# Altium schematic symbol library altera.SCHLIB: 68 symbols (part 3 of 6) (continued)
## EPF10K130-BGA672 (continued)
part 183 pins: AF4 NC
part 184 pins: AF5 NC
part 185 pins: AF6 NC
part 186 pins: AF7 NC
part 187 pins: AF8 NC
part 188 pins: AF9 NC
part 189 pins: AF10 NC
part 190 pins: AF11 NC
part 191 pins: AF12 NC
part 192 pins: AF13 NC
part 193 pins: AF14 NC
part 194 pins: AF15 NC
part 195 pins: AF16 NC
part 196 pins: AF17 NC
part 197 pins: AF18 NC
part 198 pins: AF20 NC
part 199 pins: AF21 NC
part 200 pins: AF23 NC
part 201 pins: AF24 NC
part 202 pins: A3 NC
part 203 pins: A4 NC
part 204 pins: A5 NC
part 205 pins: A6 NC
part 206 pins: A8 NC
part 207 pins: A9 NC
part 208 pins: A10 NC
part 209 pins: A11 NC
part 210 pins: A12 NC
part 211 pins: A13 NC
part 212 pins: A14 NC
part 213 pins: A15 NC
part 214 pins: A16 NC
part 215 pins: A17 NC
part 216 pins: A18 NC
part 217 pins: A19 NC
part 218 pins: A20 NC
part 219 pins: A21 NC
part 220 pins: A22 NC
part 221 pins: A23 NC
part 222 pins: A24 NC
part 223 pins: B3 NC
part 224 pins: B4 NC
part 225 pins: B5 NC
part 226 pins: B6 NC
part 227 pins: B7 NC
part 228 pins: B8 NC
part 229 pins: B9 NC
part 230 pins: B10 NC
part 231 pins: B11 NC
part 232 pins: B12 NC
part 233 pins: B13 NC
part 234 pins: B14 NC
part 235 pins: B16 NC
part 236 pins: B19 NC
part 237 pins: B20 NC
part 238 pins: B21 NC
part 239 pins: B22 NC
part 240 pins: B23 NC
part 241 pins: B24 NC
part 242 pins: B26 NC
part 243 pins: C1 NC
part 244 pins: C25 NC
part 245 pins: C26 NC
part 246 pins: D1 NC
part 247 pins: D2 NC
part 248 pins: D25 NC
part 249 pins: D26 NC
part 250 pins: E1 NC
part 251 pins: E25 NC
part 252 pins: E26 NC
part 253 pins: F1 NC
part 254 pins: F25 NC
part 255 pins: G25 NC
part 256 pins: G26 NC
part 257 pins: H1 NC
part 258 pins: J1 NC
part 259 pins: J25 NC
part 260 pins: J26 NC
part 261 pins: K26 NC
part 262 pins: L2 NC
part 263 pins: L25 NC
part 264 pins: N2 NC
part 265 pins: P1 NC
part 266 pins: P2 NC
part 267 pins: R1 NC
part 268 pins: R26 NC
part 269 pins: T1 NC
part 270 pins: U1 NC
part 271 pins: U25 NC
part 272 pins: V1 NC
part 273 pins: V26 NC
part 274 pins: W1 NC
part 275 pins: Y26 NC

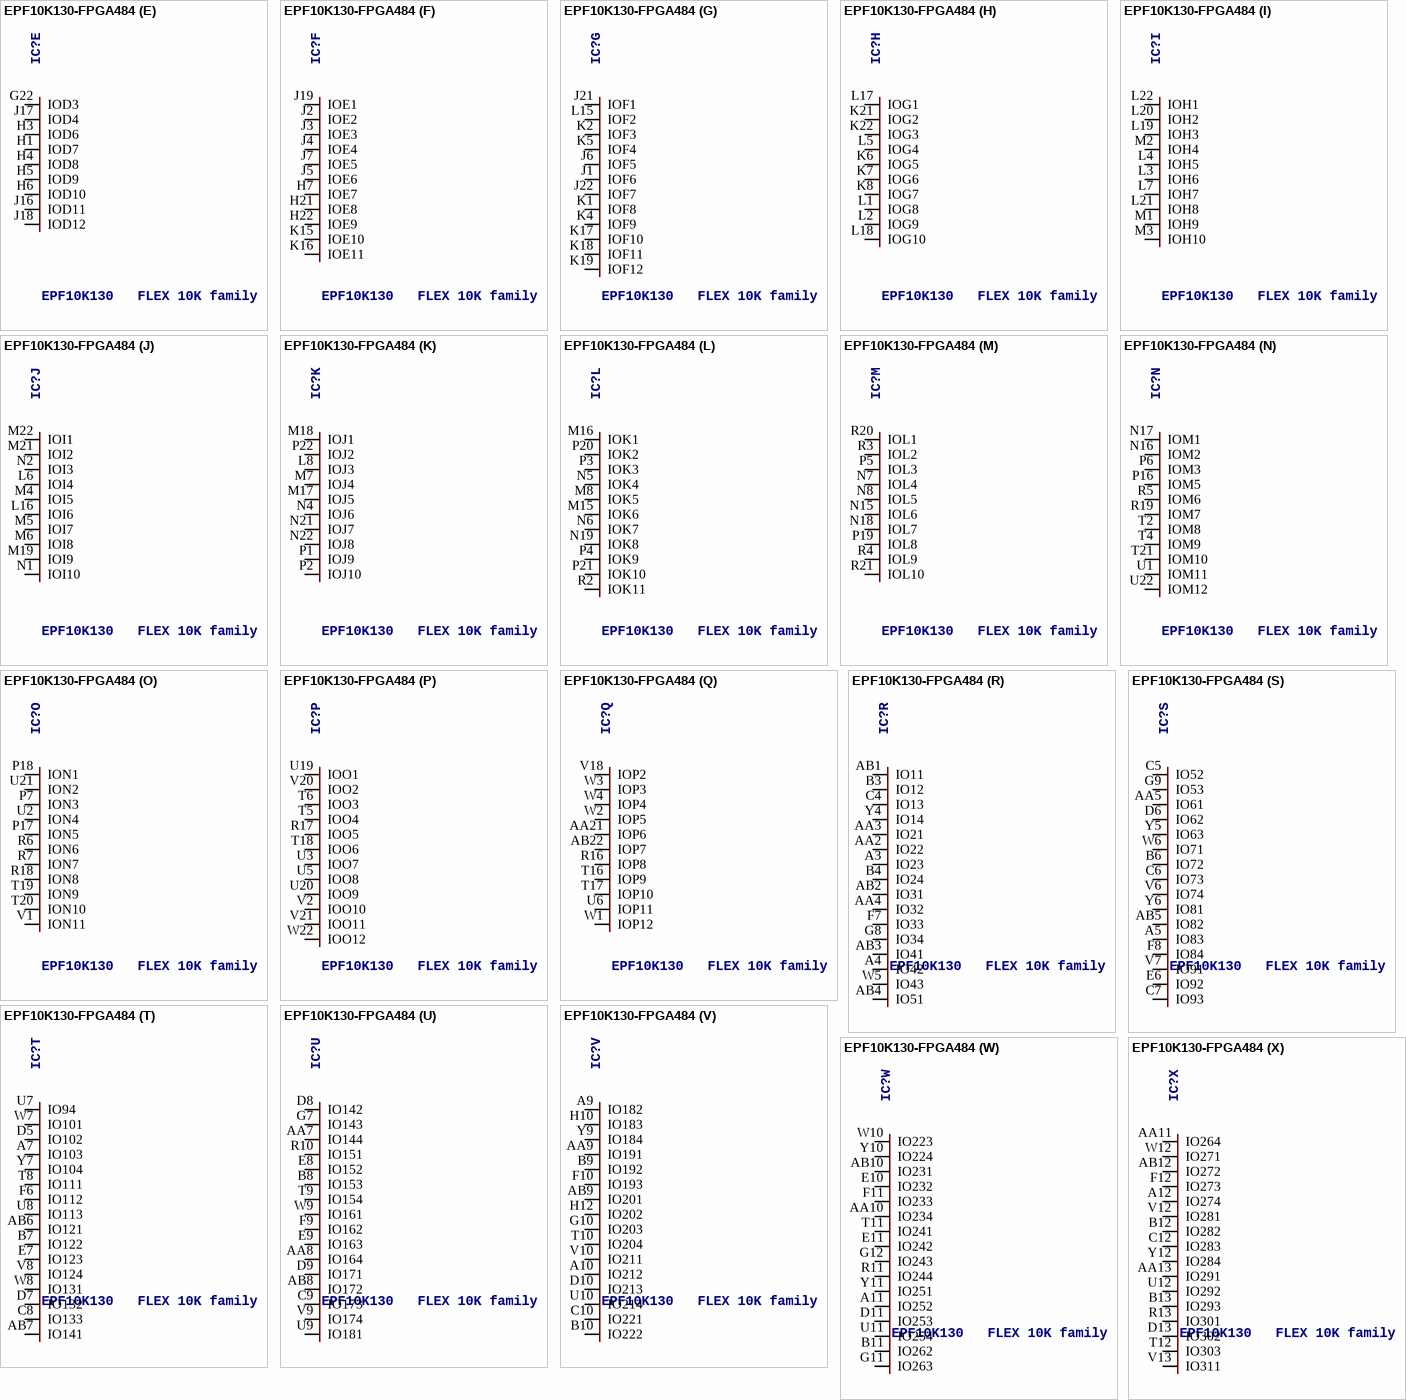
[diagram p25: symbol EPF10K130-FPGA484]

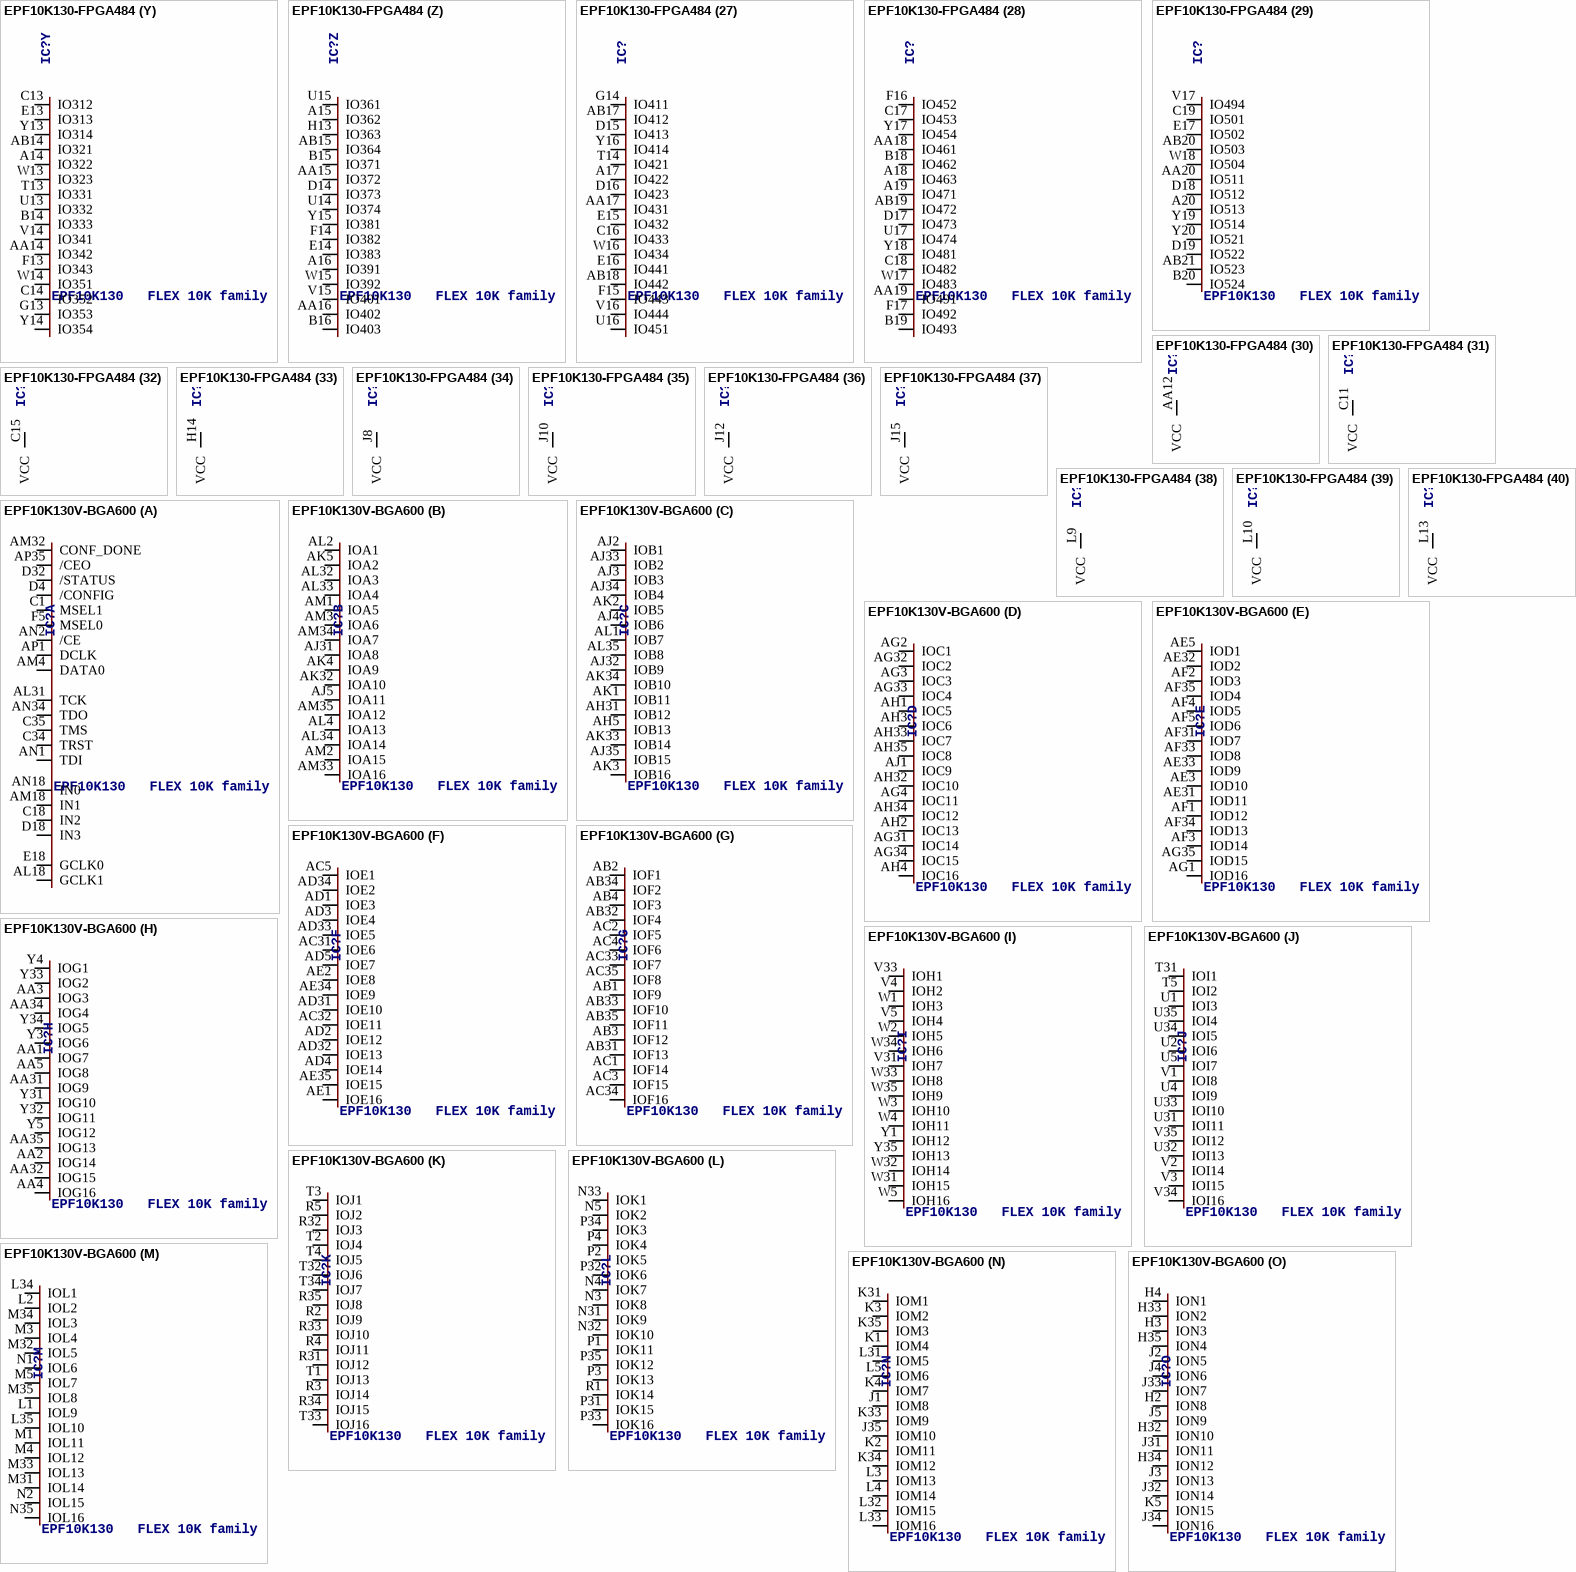
[diagram p26: symbols EPF10K130-FPGA484 to EPF10K130V-BGA600]

## EPF10K130-FPGA484
designator IC?, comment EPF10K130   FLEX 10K family
MPN: EPF10K130EFC484-1; OC_FARNELL: unknown; OC_NEWARK: 51R8855
footprint FBGA484
part A pins: D4 DATA0, D12 GCLK1, E4 /CE, E5 DCLK, E12 IN3, E18 TCK, E19 /CEO, F5 TDI, F18 CONF_DONE, F19 TDO, H11 IN2, P11 GCLK0, R12 IN0, T7 /CONFIG, U4 MSEL0, U18 TMS, V4 MSEL1, V11 IN1, V19 TRST, W19 /STATUS
part B pins: A2 IOA7, A21 IOA1, C1 IOA8, C3 IOA9, C20 IOA4, C22 IOA2, D2 IOA6, D3 IOA10, D20 IOA3, E3 IOA11, E20 IOA12, G18 IOA5
part C pins: D1 IOB7, D21 IOB1, D22 IOB2, E2 IOB6, E22 IOB4, F2 IOB8, F3 IOB9, F4 IOB5, F20 IOB10, G16 IOB3, G17 IOB11, H16 IOB12
part D pins: F1 IOC6, F21 IOC1, F22 IOC7, G2 IOC8, G4 IOC9, G5 IOC5, G6 IOC4, G19 IOC2, G20 IOC10, H17 IOC3, H18 IOC11, H19 IOC12
part E pins: G22 IOD3, H1 IOD7, H3 IOD6, H4 IOD8, H5 IOD9, H6 IOD10, J16 IOD11, J17 IOD4, J18 IOD12
part F pins: H7 IOE7, H21 IOE8, H22 IOE9, J2 IOE2, J3 IOE3, J4 IOE4, J5 IOE6, J7 IOE5, J19 IOE1, K15 IOE10, K16 IOE11
part G pins: J1 IOF6, J6 IOF5, J21 IOF1, J22 IOF7, K1 IOF8, K2 IOF3, K4 IOF9, K5 IOF4, K17 IOF10, K18 IOF11, K19 IOF12, L15 IOF2
part H pins: K6 IOG5, K7 IOG6, K8 IOG7, K21 IOG2, K22 IOG3, L1 IOG8, L2 IOG9, L5 IOG4, L17 IOG1, L18 IOG10
part I pins: L3 IOH6, L4 IOH5, L7 IOH7, L19 IOH3, L20 IOH2, L21 IOH8, L22 IOH1, M1 IOH9, M2 IOH4, M3 IOH10
part J pins: L6 IOI4, L16 IOI6, M4 IOI5, M5 IOI7, M6 IOI8, M19 IOI9, M21 IOI2, M22 IOI1, N1 IOI10, N2 IOI3
part K pins: L8 IOJ3, M7 IOJ4, M17 IOJ5, M18 IOJ1, N4 IOJ6, N21 IOJ7, N22 IOJ8, P1 IOJ9, P2 IOJ10, P22 IOJ2
part L pins: M8 IOK5, M15 IOK6, M16 IOK1, N5 IOK4, N6 IOK7, N19 IOK8, P3 IOK3, P4 IOK9, P20 IOK2, P21 IOK10, R2 IOK11
part M pins: N7 IOL4, N8 IOL5, N15 IOL6, N18 IOL7, P5 IOL3, P19 IOL8, R3 IOL2, R4 IOL9, R20 IOL1, R21 IOL10
part N pins: N16 IOM2, N17 IOM1, P6 IOM3, P16 IOM5, R5 IOM6, R19 IOM7, T2 IOM8, T4 IOM9, T21 IOM10, U1 IOM11, U22 IOM12
part O pins: P7 ION3, P17 ION5, P18 ION1, R6 ION6, R7 ION7, R18 ION8, T19 ION9, T20 ION10, U2 ION4, U21 ION2, V1 ION11
part P pins: R17 IOO5, T5 IOO4, T6 IOO3, T18 IOO6, U3 IOO7, U5 IOO8, U19 IOO1, U20 IOO9, V2 IOO10, V20 IOO2, V21 IOO11, W22 IOO12
part Q pins: AA21 IOP6, AB22 IOP7, R16 IOP8, T16 IOP9, T17 IOP10, U6 IOP11, V18 IOP2, W1 IOP12, W2 IOP5, W3 IOP3, W4 IOP4
part R pins: A3 IO23, A4 IO42, AA2 IO22, AA3 IO21, AA4 IO32, AB1 IO11, AB2 IO31, AB3 IO41, AB4 IO51, B3 IO12, B4 IO24, C4 IO13, F7 IO33, G8 IO34, W5 IO43, Y4 IO14
part S pins: A5 IO83, AA5 IO61, AB5 IO82, B6 IO72, C5 IO52, C6 IO73, C7 IO93, D6 IO62, E6 IO92, F8 IO84, G9 IO53, V6 IO74, V7 IO91, W6 IO71, Y5 IO63, Y6 IO81
part T pins: A7 IO103, AB6 IO121, AB7 IO141, B7 IO122, C8 IO133, D5 IO102, D7 IO132, E7 IO123, F6 IO112, T8 IO111, U7 IO94, U8 IO113, V8 IO124, W7 IO101, W8 IO131, Y7 IO104
part U pins: AA7 IO144, AA8 IO164, AB8 IO172, B8 IO153, C9 IO173, D8 IO142, D9 IO171, E8 IO152, E9 IO163, F9 IO162, G7 IO143, R10 IO151, T9 IO154, U9 IO181, V9 IO174, W9 IO161
part V pins: A9 IO182, A10 IO212, AA9 IO191, AB9 IO201, B9 IO192, B10 IO222, C10 IO221, D10 IO213, F10 IO193, G10 IO203, H10 IO183, H12 IO202, T10 IO204, U10 IO214, V10 IO211, Y9 IO184
part W pins: A11 IO252, AA10 IO234, AB10 IO231, B11 IO262, D11 IO253, E10 IO232, E11 IO242, F11 IO233, G11 IO263, G12 IO243, R11 IO244, T11 IO241, U11 IO254, W10 IO223, Y10 IO224, Y11 IO251
part X pins: A12 IO274, AA11 IO264, AA13 IO291, AB12 IO272, B12 IO282, B13 IO293, C12 IO283, D13 IO302, F12 IO273, R13 IO301, T12 IO303, U12 IO292, V12 IO281, V13 IO311, W12 IO271, Y12 IO284
part Y pins: A14 IO322, AA14 IO342, AB14 IO321, B14 IO333, C13 IO312, C14 IO352, E13 IO313, F13 IO343, G13 IO353, T13 IO331, U13 IO332, V14 IO341, W13 IO323, W14 IO351, Y13 IO314, Y14 IO354
part Z pins: A15 IO362, A16 IO391, AA15 IO372, AA16 IO402, AB15 IO364, B15 IO371, B16 IO403, D14 IO373, E14 IO383, F14 IO382, H13 IO363, U14 IO374, U15 IO361, V15 IO401, W15 IO392, Y15 IO381
part 27 pins: A17 IO422, AA17 IO431, AB17 IO412, AB18 IO442, C16 IO433, D15 IO413, D16 IO423, E15 IO432, E16 IO441, F15 IO443, G14 IO411, T14 IO421, U16 IO451, V16 IO444, W16 IO434, Y16 IO414
part 28 pins: A18 IO463, A19 IO471, AA18 IO461, AA19 IO491, AB19 IO472, B18 IO462, B19 IO493, C17 IO453, C18 IO482, D17 IO473, F16 IO452, F17 IO492, U17 IO474, W17 IO483, Y17 IO454, Y18 IO481
part 29 pins: A20 IO513, AA20 IO511, AB20 IO503, AB21 IO523, B20 IO524, C19 IO501, D18 IO512, D19 IO522, E17 IO502, V17 IO494, W18 IO504, Y19 IO514, Y20 IO521
part 30 pins: AA12 VCC (power)
part 31 pins: C11 VCC (power)
part 32 pins: C15 VCC (power)
part 33 pins: H14 VCC (power)
part 34 pins: J8 VCC (power)
part 35 pins: J10 VCC (power)
part 36 pins: J12 VCC (power)
part 37 pins: J15 VCC (power)
part 38 pins: L9 VCC (power)
part 39 pins: L10 VCC (power)
part 40 pins: L13 VCC (power)
part 41 pins: M10 VCC (power)
part 42 pins: M13 VCC (power)
part 43 pins: M14 VCC (power)
part 44 pins: N12 VCC (power)
part 45 pins: P8 VCC (power)
part 46 pins: P10 VCC (power)
part 47 pins: P12 VCC (power)
part 48 pins: P15 VCC (power)
part 49 pins: R14 VCC (power)
part 50 pins: V5 VCC (power)
part 51 pins: W21 VCC (power)
part 52 pins: Y8 VCC (power)
part 53 pins: AB13 VCCIO (power)
part 54 pins: A6 VCCIO (power)
part 55 pins: A13 VCCIO (power)
part 56 pins: B5 VCCIO (power)
part 57 pins: E1 VCCIO (power)
part 58 pins: G1 VCCIO (power)
part 59 pins: G15 VCCIO (power)
part 60 pins: H9 VCCIO (power)
part 61 pins: H20 VCCIO (power)
part 62 pins: J11 VCCIO (power)
part 63 pins: J13 VCCIO (power)
part 64 pins: K9 VCCIO (power)
part 65 pins: K11 VCCIO (power)
part 66 pins: K14 VCCIO (power)
part 67 pins: K20 VCCIO (power)
part 68 pins: L14 VCCIO (power)
part 69 pins: M9 VCCIO (power)
part 70 pins: N3 VCCIO (power)
part 71 pins: N9 VCCIO (power)
part 72 pins: N11 VCCIO (power)
part 73 pins: N14 VCCIO (power)
part 74 pins: N20 VCCIO (power)
part 75 pins: P13 VCCIO (power)
part 76 pins: R1 VCCIO (power)
part 77 pins: R9 VCCIO (power)
part 78 pins: T3 VCCIO (power)
part 79 pins: T15 VCCIO (power)
part 80 pins: T22 VCCIO (power)
part 81 pins: V22 VCCIO (power)
part 82 pins: AA1 GND (power)
part 83 pins: AA6 GND (power)
part 84 pins: AA22 GND (power)
part 85 pins: AB11 GND (power)
part 86 pins: AB16 GND (power)
part 87 pins: A1 GND (power)
part 88 pins: A8 GND (power)
part 89 pins: A22 GND (power)
part 90 pins: B1 GND (power)
part 91 pins: B2 GND (power)
part 92 pins: B17 GND (power)
part 93 pins: B21 GND (power)
part 94 pins: B22 GND (power)
part 95 pins: C2 GND (power)
part 96 pins: C21 GND (power)
part 97 pins: E21 GND (power)
part 98 pins: G3 GND (power)
part 99 pins: G21 GND (power)
part 100 pins: H2 GND (power)
part 101 pins: H8 GND (power)
part 102 pins: H15 GND (power)
part 103 pins: J9 GND (power)
part 104 pins: J14 GND (power)
part 105 pins: J20 GND (power)
part 106 pins: K3 GND (power)
part 107 pins: K10 GND (power)
part 108 pins: K12 GND (power)
part 109 pins: K13 GND (power)
part 110 pins: L11 GND (power)
part 111 pins: L12 GND (power)
part 112 pins: M11 GND (power)
part 113 pins: M12 GND (power)
part 114 pins: M20 GND (power)
part 115 pins: N10 GND (power)
part 116 pins: N13 GND (power)
part 117 pins: P9 GND (power)
part 118 pins: P14 GND (power)
part 119 pins: R8 GND (power)
part 120 pins: R15 GND (power)
part 121 pins: R22 GND (power)
part 122 pins: T1 GND (power)
part 123 pins: W11 GND (power)
part 124 pins: W20 GND (power)
part 125 pins: Y1 GND (power)
part 126 pins: Y2 GND (power)
part 127 pins: Y3 GND (power)
part 128 pins: Y21 GND (power)
part 129 pins: Y22 GND (power)
part 130 pins: V3 GND (power)

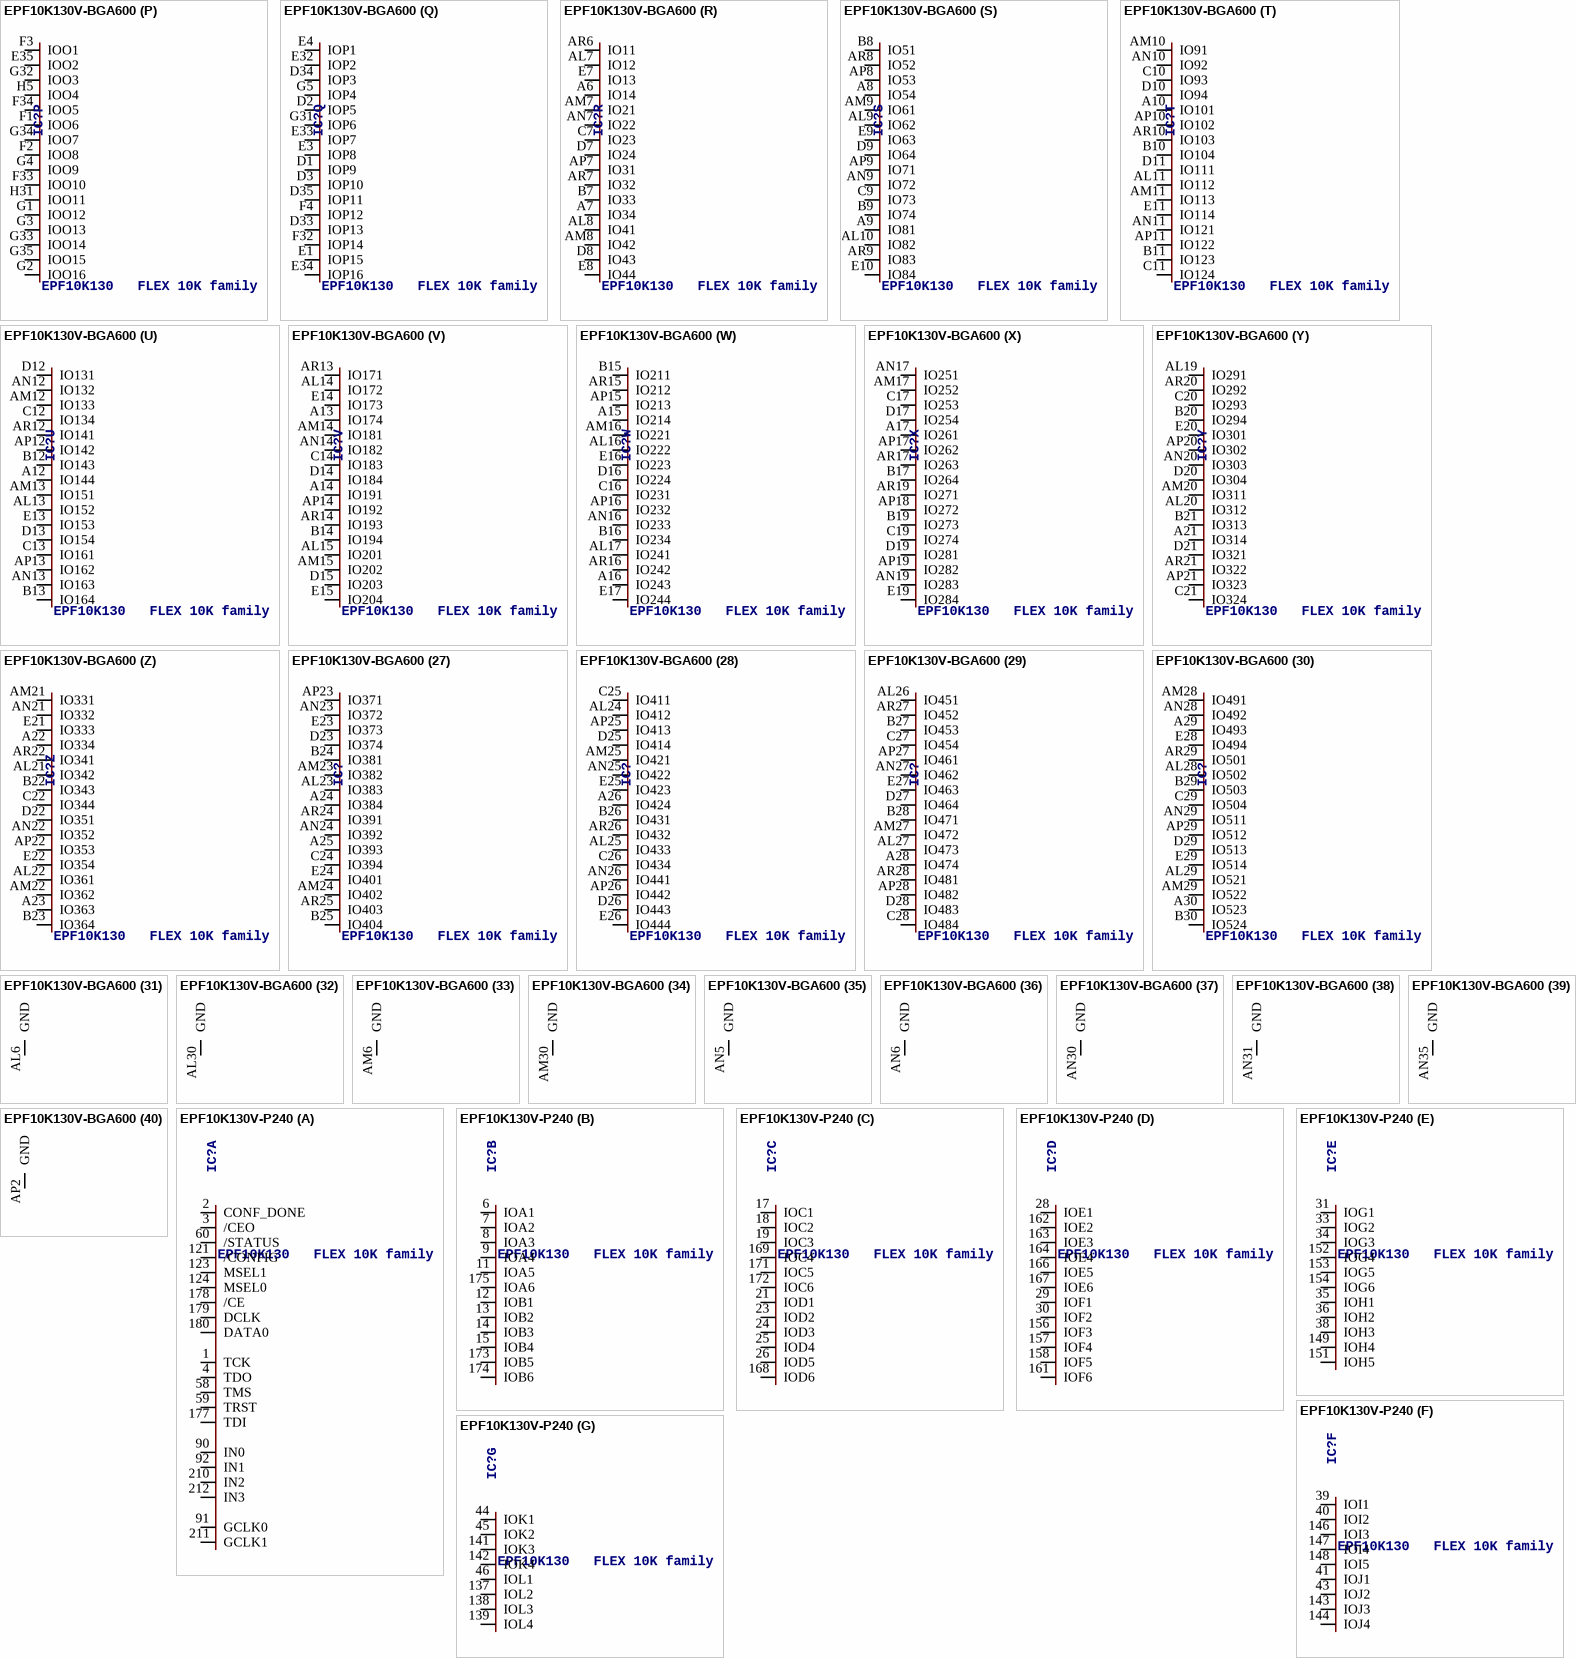
[diagram p27: symbols EPF10K130V-BGA600 to EPF10K130V-P240]